# Altium footprint library ESKDPcbLib.PcbLib: 608 footprints (part 21 of 38)
Each footprint in its own frame and in the unit in brackets; x right, y up, seen from the top. Pads: shape width x height; smd on the part's side, far side on the other; paste and mask are expansions set on the pad; w line width, h text height; cw(c..) or ccw(c..) is an arc to the next point about the centre after c.
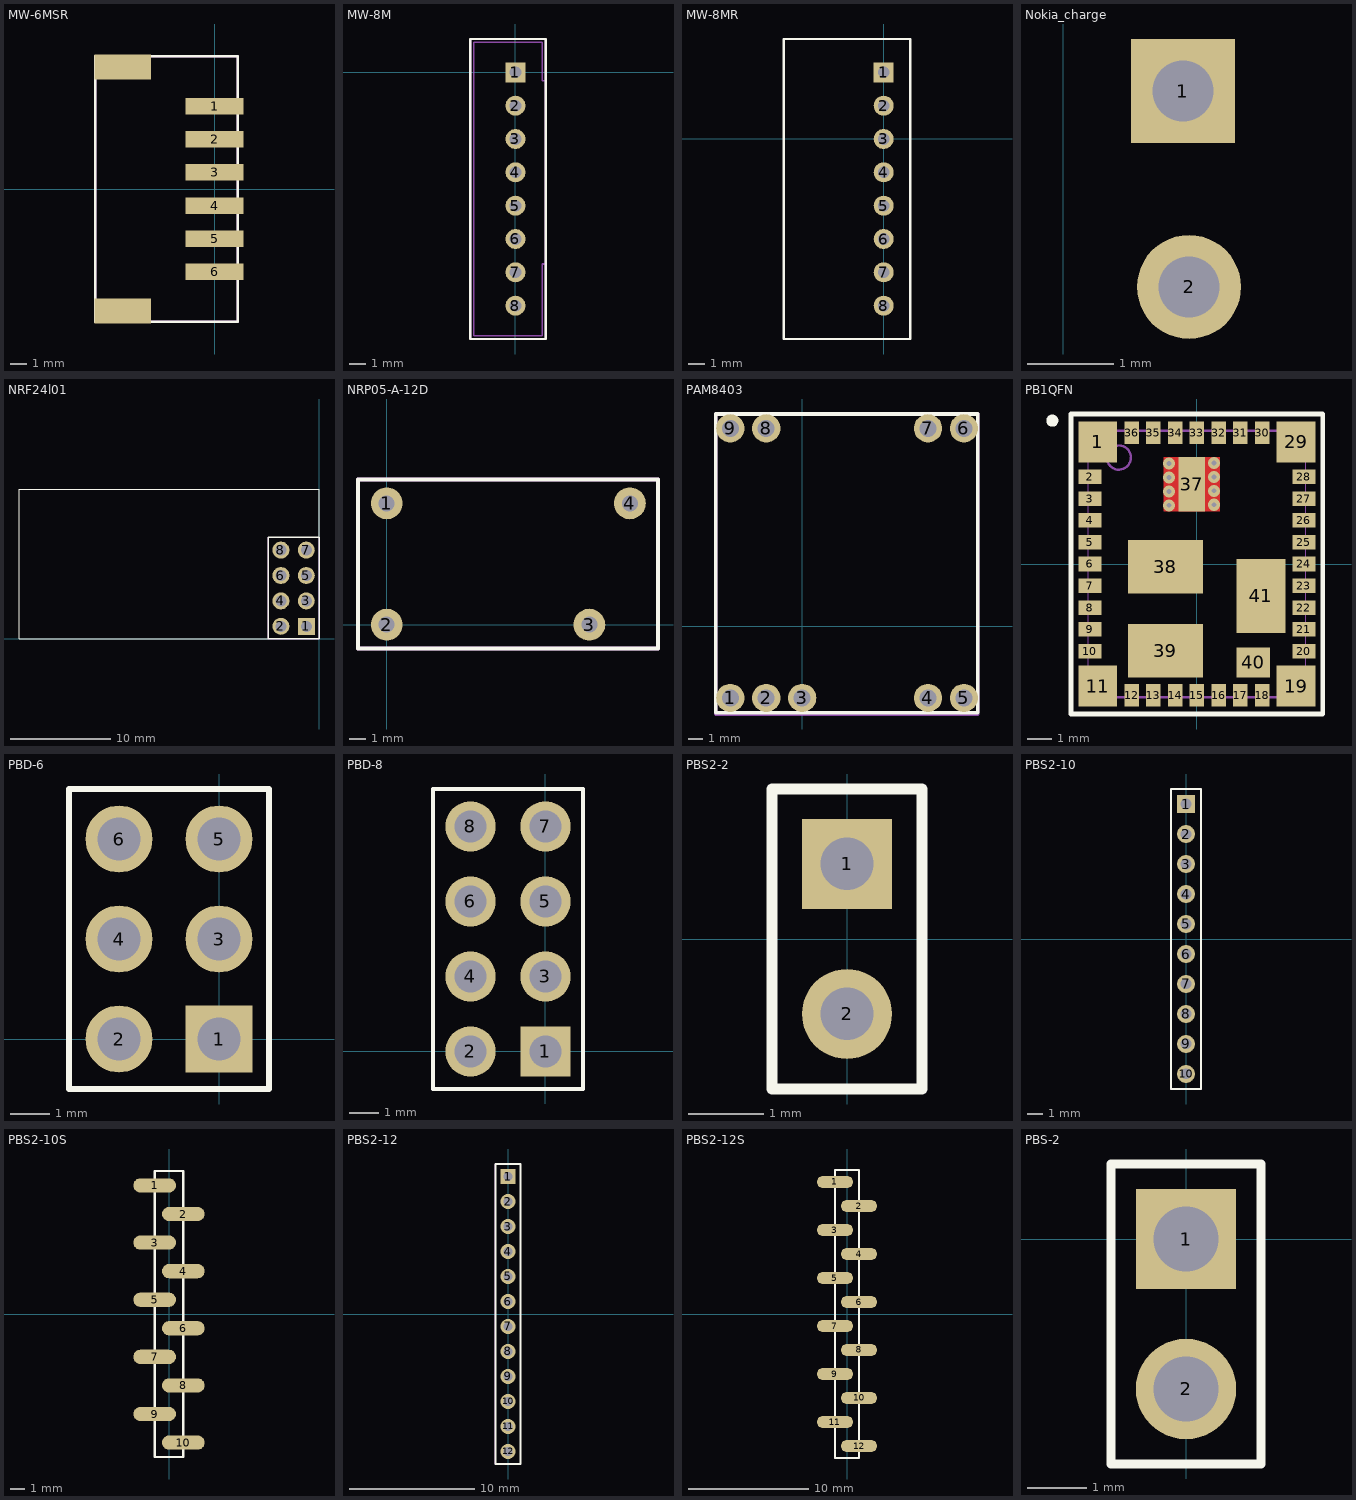
[diagram p20: the footprints below, top view; thin cyan lines are the x and y axes]

## MW-6MSR [mm]
pads (8):
  rect 3.5x1 smd: 1(0,5) 2(0,3) 3(0,1) 4(0,-1) 5(0,-3) 6(0,-5)
  rect 3.4x1.5 smd: ""(-5.55,-7.35) ""(-5.55,7.35)
Top Overlay:
  lines w0.15: -7.2,-8 1.4,-8 1.4,8 -7.2,8 -7.2,-8
Mechanical 7:
  lines w0.15: -7.2,-8 1.4,-8 1.4,8 -7.2,8 -7.2,-8
Mechanical 10:
  text ".Comment" at -3.42,7.46 h0.6
  text ".Designator" at -3.43,8.03 h0.8
3D body: height 5.5, standoff -0.1, extent -7.2,-7.95 1.4,7.95

## MW-8M [mm]
pads (8):
  rect 1.2x1.2 hole 0.7: 1(0,0)
  round 1.2 hole 0.7: 2(0,-2) 3(0,-4) 4(0,-6) 5(0,-8) 6(0,-10) 7(0,-12) 8(0,-14)
Top Overlay:
  lines w0.15: -2.7,-16 -2.7,2 1.8,2 1.8,-16 -2.7,-16
Mechanical 7:
  lines w0.1: 1.79,-11.5 1.6,-11.5 1.6,-15.8 -2.5,-15.8 -2.5,1.8 1.6,1.8 1.6,-0.5 1.79,-0.5 ; -2.7,-16 -2.7,2 1.8,2 1.8,-16 -2.7,-16
Mechanical 10:
  text ".Designator" at -1.28,2.98 h0.8
  text ".Comment" at -1.27,2.41 h0.6
3D body: height 6, standoff -3, extent -2.8,-15.975 1.7,1.925

## MW-8MR [mm]
pads (8):
  rect 1.2x1.2 hole 0.7: 1(0,4)
  round 1.2 hole 0.7: 2(0,2) 3(0,0) 4(0,-2) 5(0,-4) 6(0,-6) 7(0,-8) 8(0,-10)
Top Overlay:
  lines w0.15: -6,-12 1.6,-12 1.6,6 -6,6 -6,-12
Mechanical 7:
  lines w0.1: -6,-12 1.6,-12 1.6,6 -6,6 -6,-12
Mechanical 10:
  text ".Designator" at -3.43,7.03 h0.8
  text ".Comment" at -3.42,6.46 h0.6
3D body: height 4.8, standoff -3.4, extent -6,-11.95 1.6,5.95

## Nokia_charge [mm]
pads (2):
  rect 1.2x1.2 hole 0.7: 1(1.38,-1.48)
  round 1.2 hole 0.7: 2(1.45,-3.74)
3D body: height 3.7, standoff 0.1, extent 0,-5.2 6.9,0

## NRF24l01 [mm]
pads (8):
  rect 1.7x1.7 hole 1.1: 1(-1.27,1.27)
  round 1.7 hole 1.1: 2(-3.81,1.27) 3(-1.27,3.81) 4(-3.81,3.81) 5(-1.27,6.35) 6(-3.81,6.35) 7(-1.27,8.89) 8(-3.81,8.89)
Top Overlay:
  lines w0.1: 0,0 -30,0 -30,15 0,15 0,10.16
  lines w0.15: -5.08,0 0,0 0,10.16 -5.08,10.16 -5.08,0
Mechanical 7:
  lines w0.1: -5.08,0 0,0 0,10.16 -5.08,10.16 -5.08,0
Mechanical 10:
  text ".Designator" at -2.54,11.43 h1
  text ".Comment" at -2.54,12.7 h1
3D body: height 8.5, standoff -3.15, extent -5.08,0 0,10.16

## NRP05-A-12D [mm]
pads (4):
  round 2 hole 1: 1(0,7.6) 2(0,0) 3(12.7,0) 4(15.24,7.6)
Top Overlay:
  lines w0.254: -1.8,-1.5 17,-1.5 17,9.1 -1.8,9.1 -1.8,-1.5
Mechanical 7:
  lines w0.254: -1.8,-1.5 17,-1.5 17,9.1 -1.8,9.1 -1.8,-1.5
Mechanical 10:
  text ".Designator" at 8.35,10.55 h1
  text ".Comment" at 8.35,9.55 h1
3D body: height 15.6, standoff 0, extent -1.8,-1.5 17,9.1

## PAM8403 [mm]
pads (9):
  round 2 hole 1.2: 1(-5.08,-5.08) 2(-2.54,-5.08) 3(0,-5.08) 4(8.89,-5.08) 5(11.43,-5.08) 6(11.43,13.97) 7(8.89,13.97) 8(-2.54,13.97) 9(-5.08,13.97)
Top Overlay:
  lines w0.254: -6.096,-6.114 -6.096,14.986 12.404,14.986 12.404,-6.114 -6.096,-6.114
Mechanical 7:
  lines w0.254: -6.096,-6.214 -6.096,14.986 12.404,14.986 12.404,-6.214 -6.096,-6.214
Mechanical 10:
  text ".Designator" at -5.47,16.492 h1
  text ".Comment" at -5.47,15.492 h1

## PB1QFN [mm]
height 2.9
pads (41):
  rect 1.6x1.7 smd: 1(-4.1,5.05) 11(-4.1,-5.05) 19(4.1,-5.05) 29(4.1,5.05)
  rect 0.95x0.6 smd: 2(-4.425,3.6) 3(-4.425,2.7) 4(-4.425,1.8) 5(-4.425,0.9) 6(-4.425,0) 7(-4.425,-0.9) 8(-4.425,-1.8) 9(-4.425,-2.7) 10(-4.425,-3.6) 20(4.425,-3.6) 21(4.425,-2.7) 22(4.425,-1.8) 23(4.425,-0.9) 24(4.425,0) 25(4.425,0.9) 26(4.425,1.8) 27(4.425,2.7) 28(4.425,3.6)
  rect 0.6x0.95 smd: 12(-2.7,-5.425) 13(-1.8,-5.425) 14(-0.9,-5.425) 15(0,-5.425) 16(0.9,-5.425) 17(1.8,-5.425) 18(2.7,-5.425) 30(2.7,5.425) 31(1.8,5.425) 32(0.9,5.425) 33(0,5.425) 34(-0.9,5.425) 35(-1.8,5.425) 36(-2.7,5.425)
  rect 1.1x2.25 smd: 37(-0.22,3.3)
  rect 3.1x2.2 smd: 38(-1.3,-0.11) 39(-1.3,-3.59)
  rect 1.4x1.24 smd: 40(2.33,-4.07)
  rect 2.04x3.05 smd: 41(2.65,-1.32)
via -1.15,4.15 diameter 0.5 hole 0.2
via -1.15,3.575 diameter 0.5 hole 0.2
via -1.15,3 diameter 0.5 hole 0.2
via -1.15,2.425 diameter 0.5 hole 0.2
via 0.71,4.175 diameter 0.5 hole 0.2
via 0.71,3.6 diameter 0.5 hole 0.2
via 0.71,3.025 diameter 0.5 hole 0.2
via 0.71,2.45 diameter 0.5 hole 0.2
Top Layer:
  rectangle: -1.375,2.175 0.95,4.425
Top Overlay:
  circle w0.25: c-5.975,5.925 r0.125
  lines w0.2: -5.2,-6.2 -5.2,6.2 5.2,6.2 5.2,-6.2 -5.2,-6.2
Mechanical 7:
  lines w0.05: -4.5,-5.5 4.5,-5.5 4.5,5.5 -4.5,5.5 -4.5,-5.5
Mechanical 9:
  circle w0.1: c-3.225,4.4 r0.5
  lines w0.1: -4.5,-5.5 4.5,-5.5 ; -4.5,5.5 4.5,5.5
3D body: height 2.9, standoff 0.05, extent -4.5,-5.5 4.5,5.5

## PBD-6 [mm]
pads (6):
  rect 1.7x1.7 hole 1.1: 1(0,0)
  round 1.7 hole 1.1: 2(-2.54,0) 3(0,2.54) 4(-2.54,2.54) 5(0,5.08) 6(-2.54,5.08)
Top Overlay:
  lines w0.15: -3.81,-1.27 1.27,-1.27 1.27,6.35 -3.81,6.35 -3.81,-1.27
Mechanical 7:
  lines w0.1: -3.81,-1.27 1.27,-1.27 1.27,6.35 -3.81,6.35 -3.81,-1.27
Mechanical 10:
  text ".Designator" at -1.27,7.62 h1
  text ".Comment" at -1.27,8.89 h1

## PBD-8 [mm]
pads (8):
  rect 1.7x1.7 hole 1.1: 1(0,0)
  round 1.7 hole 1.1: 2(-2.54,0) 3(0,2.54) 4(-2.54,2.54) 5(0,5.08) 6(-2.54,5.08) 7(0,7.62) 8(-2.54,7.62)
Top Overlay:
  lines w0.15: -3.81,-1.27 1.27,-1.27 1.27,8.89 -3.81,8.89 -3.81,-1.27
Mechanical 7:
  lines w0.1: -3.81,-1.27 1.27,-1.27 1.27,8.89 -3.81,8.89 -3.81,-1.27
Mechanical 10:
  text ".Designator" at -1.27,10.16 h1
  text ".Comment" at -1.27,11.43 h1
3D body: height 8.5, standoff -3.15, extent -3.81,-1.27 1.27,8.89

## PBS2-2 [mm]
height 4.5
pads (2):
  rect 1.2x1.2 hole 0.7: 1(0,1)
  round 1.2 hole 0.7: 2(0,-1)
Top Overlay:
  lines w0.15: -1,-2 1,-2 1,2 -1,2 -1,-2
Mechanical 7:
  lines w0.1: -1,-2 1,-2 1,2 -1,2 -1,-2
Mechanical 10:
  text ".Designator" at -0.575,3.15 h0.8
  text ".Comment" at -0.575,2.475 h0.6
3D body: height 4.5, standoff 0, extent -1,-2 1,2

## PBS2-10 [mm]
height 4.5
pads (10):
  rect 1.2x1.2 hole 0.7: 1(0,9)
  round 1.2 hole 0.7: 2(0,7) 3(0,5) 4(0,3) 5(0,1) 6(0,-1) 7(0,-3) 8(0,-5) 9(0,-7) 10(0,-9)
Top Overlay:
  lines w0.15: -1,-10 -1,10 1,10 1,-10 -1,-10
Mechanical 7:
  lines w0.1: -1,-10 1,-10 1,10 -1,10 -1,-10
Mechanical 10:
  text ".Comment" at -0.575,10.475 h0.6
  text ".Designator" at -0.575,11.15 h0.8
3D body: height 4.5, standoff 0, extent -1,-10 1,10

## PBS2-10S [mm]
height 4.5
pads (10):
  oval 3x1 smd: 1(-1,9) 2(1,7) 3(-1,5) 4(1,3) 5(-1,1) 6(1,-1) 7(-1,-3) 8(1,-5) 9(-1,-7) 10(1,-9)
Top Overlay:
  lines w0.15: -1,-10 -1,10 1,10 1,-10 -1,-10
Mechanical 7:
  lines w0.1: -1,-10 1,-10 1,10 -1,10 -1,-10
Mechanical 10:
  text ".Comment" at -0.575,10.475 h0.6
  text ".Designator" at -0.575,11.15 h0.8
3D body: height 4.5, standoff 0, extent -1,-10 1,10

## PBS2-12 [mm]
height 4.5
pads (12):
  rect 1.2x1.2 hole 0.7: 1(0,11)
  round 1.2 hole 0.7: 2(0,9) 3(0,7) 4(0,5) 5(0,3) 6(0,1) 7(0,-1) 8(0,-3) 9(0,-5) 10(0,-7) 11(0,-9) 12(0,-11)
Top Overlay:
  lines w0.15: -1,-12 -1,12 1,12 1,-12 -1,-12
Mechanical 7:
  lines w0.1: -1,-12 -1,12 1,12 1,-12 -1,-12
Mechanical 10:
  text ".Comment" at -0.575,12.475 h0.6
  text ".Designator" at -0.575,13.15 h0.8
3D body: height 4.5, standoff 0, extent -1,-12 1,12

## PBS2-12S [mm]
height 4.5
pads (12):
  oval 3x1 smd: 1(-1,11) 2(1,9) 3(-1,7) 4(1,5) 5(-1,3) 6(1,1) 7(-1,-1) 8(1,-3) 9(-1,-5) 10(1,-7) 11(-1,-9) 12(1,-11)
Top Overlay:
  lines w0.15: -1,-12 1,-12 1,12 -1,12 -1,-12
Mechanical 7:
  lines w0.1: -1,-12 1,-12 1,12 -1,12 -1,-12
Mechanical 10:
  text ".Designator" at -0.575,13.15 h0.8
  text ".Comment" at -0.575,12.475 h0.6
3D body: height 4.5, standoff 0, extent -1,-12 1,12

## PBS-2 [mm]
pads (2):
  rect 1.7x1.7 hole 1.1: 1(0,0)
  round 1.7 hole 1.1: 2(0,-2.54)
Top Overlay:
  lines w0.15: -1.27,-3.81 1.27,-3.81 1.27,1.27 -1.27,1.27 -1.27,-3.81
Mechanical 7:
  lines w0.1: -1.27,-3.81 -1.27,1.27 1.27,1.27 1.27,-3.81 -1.27,-3.81
Mechanical 10:
  text ".Designator" at -1.27,2.54 h1
  text ".Comment" at -1.27,3.81 h1
3D body: height 8.5, standoff 0.05, extent -1.27,-3.81 1.27,1.27